# Altium footprint library 3M THD.PcbLib: 163 footprints (part 1 of 14) (continued)
## 3M_2540-6002RB [mm] "40 Contacts - Straight .100\" x .100\" Low Profile Four-Wall Header" (continued)

## 3M_2550-6002RB [mm] "50 Contacts - Straight .100\" x .100\" Low Profile Four-Wall Header"
height 10.03
pads (50):
  round 1.6 hole 1: 1(-30.48,-1.27) 2(-30.48,1.27) 3(-27.94,-1.27) 4(-27.94,1.27) 5(-25.4,-1.27) 6(-25.4,1.27) 7(-22.86,-1.27) 8(-22.86,1.27) 9(-20.32,-1.27) 10(-20.32,1.27) 11(-17.78,-1.27) 12(-17.78,1.27) 13(-15.24,-1.27) 14(-15.24,1.27) 15(-12.7,-1.27) 16(-12.7,1.27) 17(-10.16,-1.27) 18(-10.16,1.27) 19(-7.62,-1.27) 20(-7.62,1.27) 21(-5.08,-1.27) 22(-5.08,1.27) 23(-2.54,-1.27) 24(-2.54,1.27) 25(0,-1.27) 26(0,1.27) 27(2.54,-1.27) 28(2.54,1.27) 29(5.08,-1.27) 30(5.08,1.27) 31(7.62,-1.27) 32(7.62,1.27) 33(10.16,-1.27) 34(10.16,1.27) 35(12.7,-1.27) 36(12.7,1.27) 37(15.24,-1.27) 38(15.24,1.27) 39(17.78,-1.27) 40(17.78,1.27) 41(20.32,-1.27) 42(20.32,1.27) 43(22.86,-1.27) 44(22.86,1.27) 45(25.4,-1.27) 46(25.4,1.27) 47(27.94,-1.27) 48(27.94,1.27) 49(30.48,-1.27) 50(30.48,1.27)
Top Overlay:
  circle w0.3: c-30.48,-4.699 r0.15
  lines w0.2: -34.392,-1.603 -31.979,-1.603 -31.979,1.603 -34.392,1.603 ; -34.392,-1.524 -34.696,-1.524 -34.696,1.524 -34.392,1.524 ; -31.344,-4.064 -30.48,-3.2 -29.616,-4.064 ; -29.528,3.15 -34.392,3.15 -34.392,-3.2 -2.096,-3.2 ; -29.528,4.064 -29.528,2.159 -28.819,2.159 ; -27.711,-3.835 -27.711,-3.2 ; -25.629,-3.835 -25.629,-3.2 ; -25.337,2.518 -25.337,4.064 ; -25.337,3.15 25.337,3.15 ; -2.096,-4.064 -2.096,-2.438 ; 2.095,-4.064 2.095,-2.438 ; 2.095,-3.2 34.392,-3.2 34.392,3.15 31.75,3.15 ; 25.337,2.518 25.337,4.064 ; 28.169,-3.835 28.169,-3.2 ; 28.819,2.159 29.528,2.159 29.528,4.064 ; 30.251,-3.835 30.251,-3.2 ; 34.392,-1.603 31.979,-1.603 31.979,1.603 34.392,1.603 ; 34.392,-1.524 34.696,-1.524 34.696,1.524 34.392,1.524 ; -35.408,-4.064 -35.408,4.064 -34.747,4.064 cw(c-34.29,4.064) -33.833,4.064 -0.457,4.064 cw(c0,4.064) 0.457,4.064 33.833,4.064 cw(c34.29,4.064) 34.747,4.064 35.408,4.064 35.408,-4.064 31.242,-4.064 31.242,-3.835 27.178,-3.835 27.178,-4.064 -24.638,-4.064 -24.638,-3.835 -28.702,-3.835 -28.702,-4.064 -35.408,-4.064
  text "50" at 29.845,2.667 h1.02
Mechanical 14:
  lines w0.1: -34.392,-1.603 -31.979,-1.603 -31.979,1.603 -34.392,1.603 ; -34.392,-1.524 -34.696,-1.524 -34.696,1.524 -34.392,1.524 ; -31.344,-4.064 -30.48,-3.2 -29.616,-4.064 ; -29.528,3.15 -34.392,3.15 -34.392,-3.2 -2.096,-3.2 ; -29.528,4.064 -29.528,2.159 -25.337,2.159 -25.337,4.064 ; -27.711,-3.835 -27.711,-3.2 ; -25.629,-3.835 -25.629,-3.2 ; -25.337,3.15 25.337,3.15 ; -2.096,-4.064 -2.096,-2.159 2.095,-2.159 2.095,-4.064 ; 2.095,-3.2 34.392,-3.2 34.392,3.15 31.75,3.15 ; 25.337,4.064 25.337,2.159 29.528,2.159 29.528,4.064 ; 28.169,-3.835 28.169,-3.2 ; 30.251,-3.835 30.251,-3.2 ; 34.392,-1.603 31.979,-1.603 31.979,1.603 34.392,1.603 ; 34.392,-1.524 34.696,-1.524 34.696,1.524 34.392,1.524 ; -35.408,-4.064 -35.408,4.064 -34.747,4.064 cw(c-34.29,4.064) -33.833,4.064 -0.457,4.064 cw(c0,4.064) 0.457,4.064 33.833,4.064 cw(c34.29,4.064) 34.747,4.064 35.408,4.064 35.408,-4.064 31.242,-4.064 31.242,-3.835 27.178,-3.835 27.178,-4.064 -24.638,-4.064 -24.638,-3.835 -28.702,-3.835 -28.702,-4.064 -35.408,-4.064
  text "50" at 29.845,2.667 h1.02
3D body "3M_2550-6002RB.stp": height 9.65, standoff -2.59, extent -35.408,-4.064 35.408,4.572

## 3M_2560-6002RB [mm] "60 Contacts - Straight .100\" x .100\" Low Profile Four-Wall Header"
height 10.03
pads (60):
  round 1.6 hole 1: 1(-36.83,-1.27) 2(-36.83,1.27) 3(-34.29,-1.27) 4(-34.29,1.27) 5(-31.75,-1.27) 6(-31.75,1.27) 7(-29.21,-1.27) 8(-29.21,1.27) 9(-26.67,-1.27) 10(-26.67,1.27) 11(-24.13,-1.27) 12(-24.13,1.27) 13(-21.59,-1.27) 14(-21.59,1.27) 15(-19.05,-1.27) 16(-19.05,1.27) 17(-16.51,-1.27) 18(-16.51,1.27) 19(-13.97,-1.27) 20(-13.97,1.27) 21(-11.43,-1.27) 22(-11.43,1.27) 23(-8.89,-1.27) 24(-8.89,1.27) 25(-6.35,-1.27) 26(-6.35,1.27) 27(-3.81,-1.27) 28(-3.81,1.27) 29(-1.27,-1.27) 30(-1.27,1.27) 31(1.27,-1.27) 32(1.27,1.27) 33(3.81,-1.27) 34(3.81,1.27) 35(6.35,-1.27) 36(6.35,1.27) 37(8.89,-1.27) 38(8.89,1.27) 39(11.43,-1.27) 40(11.43,1.27) 41(13.97,-1.27) 42(13.97,1.27) 43(16.51,-1.27) 44(16.51,1.27) 45(19.05,-1.27) 46(19.05,1.27) 47(21.59,-1.27) 48(21.59,1.27) 49(24.13,-1.27) 50(24.13,1.27) 51(26.67,-1.27) 52(26.67,1.27) 53(29.21,-1.27) 54(29.21,1.27) 55(31.75,-1.27) 56(31.75,1.27) 57(34.29,-1.27) 58(34.29,1.27) 59(36.83,-1.27) 60(36.83,1.27)
Top Overlay:
  circle w0.3: c-36.83,-4.699 r0.15
  lines w0.2: -40.742,-1.603 -38.329,-1.603 -38.329,1.603 -40.742,1.603 ; -40.742,-1.524 -41.046,-1.524 -41.046,1.524 -40.742,1.524 ; -37.694,-4.064 -36.83,-3.2 -35.966,-4.064 ; -35.878,3.15 -40.742,3.15 -40.742,-3.2 -3.366,-3.2 ; -35.878,4.064 -35.878,2.159 -35.169,2.159 ; -34.061,-3.835 -34.061,-3.2 ; -31.979,-3.835 -31.979,-3.2 ; -31.687,2.518 -31.687,4.064 ; -31.687,3.15 31.687,3.15 ; -3.366,-4.064 -3.366,-2.438 ; 0.826,-4.064 0.826,-2.438 ; 0.826,-3.2 40.742,-3.2 40.742,3.15 38.1,3.15 ; 31.687,2.518 31.687,4.064 ; 34.519,-3.835 34.519,-3.2 ; 35.169,2.159 35.878,2.159 35.878,4.064 ; 36.601,-3.835 36.601,-3.2 ; 40.742,-1.603 38.329,-1.603 38.329,1.603 40.742,1.603 ; 40.742,-1.524 41.046,-1.524 41.046,1.524 40.742,1.524 ; -41.758,-4.064 -41.758,4.064 -41.097,4.064 cw(c-40.64,4.064) -40.183,4.064 -1.727,4.064 cw(c-1.27,4.064) -0.813,4.064 40.183,4.064 cw(c40.64,4.064) 41.097,4.064 41.758,4.064 41.758,-4.064 37.592,-4.064 37.592,-3.835 33.528,-3.835 33.528,-4.064 -30.988,-4.064 -30.988,-3.835 -35.052,-3.835 -35.052,-4.064 -41.758,-4.064
  text "60" at 36.195,2.667 h1.02
Mechanical 14:
  lines w0.1: -40.742,-1.603 -38.329,-1.603 -38.329,1.603 -40.742,1.603 ; -40.742,-1.524 -41.046,-1.524 -41.046,1.524 -40.742,1.524 ; -37.694,-4.064 -36.83,-3.2 -35.966,-4.064 ; -35.878,3.15 -40.742,3.15 -40.742,-3.2 -3.366,-3.2 ; -35.878,4.064 -35.878,2.159 -31.687,2.159 -31.687,4.064 ; -34.061,-3.835 -34.061,-3.2 ; -31.979,-3.835 -31.979,-3.2 ; -31.687,3.15 31.687,3.15 ; -3.366,-4.064 -3.366,-2.159 0.826,-2.159 0.826,-4.064 ; 0.826,-3.2 40.742,-3.2 40.742,3.15 38.1,3.15 ; 31.687,4.064 31.687,2.159 35.878,2.159 35.878,4.064 ; 34.519,-3.835 34.519,-3.2 ; 36.601,-3.835 36.601,-3.2 ; 40.742,-1.603 38.329,-1.603 38.329,1.603 40.742,1.603 ; 40.742,-1.524 41.046,-1.524 41.046,1.524 40.742,1.524 ; -41.758,-4.064 -41.758,4.064 -41.097,4.064 cw(c-40.64,4.064) -40.183,4.064 -1.727,4.064 cw(c-1.27,4.064) -0.813,4.064 40.183,4.064 cw(c40.64,4.064) 41.097,4.064 41.758,4.064 41.758,-4.064 37.592,-4.064 37.592,-3.835 33.528,-3.835 33.528,-4.064 -30.988,-4.064 -30.988,-3.835 -35.052,-3.835 -35.052,-4.064 -41.758,-4.064
  text "60" at 36.195,2.667 h1.02
3D body "3M_2560-6002RB.stp": height 9.65, standoff -2.59, extent -41.758,-4.064 41.758,4.572

## 3M_2564-6002RB [mm] "64 Contacts - Straight .100\" x .100\" Low Profile Four-Wall Header"
height 10.03
pads (64):
  round 1.6 hole 1: 1(-39.37,-1.27) 2(-39.37,1.27) 3(-36.83,-1.27) 4(-36.83,1.27) 5(-34.29,-1.27) 6(-34.29,1.27) 7(-31.75,-1.27) 8(-31.75,1.27) 9(-29.21,-1.27) 10(-29.21,1.27) 11(-26.67,-1.27) 12(-26.67,1.27) 13(-24.13,-1.27) 14(-24.13,1.27) 15(-21.59,-1.27) 16(-21.59,1.27) 17(-19.05,-1.27) 18(-19.05,1.27) 19(-16.51,-1.27) 20(-16.51,1.27) 21(-13.97,-1.27) 22(-13.97,1.27) 23(-11.43,-1.27) 24(-11.43,1.27) 25(-8.89,-1.27) 26(-8.89,1.27) 27(-6.35,-1.27) 28(-6.35,1.27) 29(-3.81,-1.27) 30(-3.81,1.27) 31(-1.27,-1.27) 32(-1.27,1.27) 33(1.27,-1.27) 34(1.27,1.27) 35(3.81,-1.27) 36(3.81,1.27) 37(6.35,-1.27) 38(6.35,1.27) 39(8.89,-1.27) 40(8.89,1.27) 41(11.43,-1.27) 42(11.43,1.27) 43(13.97,-1.27) 44(13.97,1.27) 45(16.51,-1.27) 46(16.51,1.27) 47(19.05,-1.27) 48(19.05,1.27) 49(21.59,-1.27) 50(21.59,1.27) 51(24.13,-1.27) 52(24.13,1.27) 53(26.67,-1.27) 54(26.67,1.27) 55(29.21,-1.27) 56(29.21,1.27) 57(31.75,-1.27) 58(31.75,1.27) 59(34.29,-1.27) 60(34.29,1.27) 61(36.83,-1.27) 62(36.83,1.27) 63(39.37,-1.27) 64(39.37,1.27)
Top Overlay:
  circle w0.3: c-39.37,-4.699 r0.15
  lines w0.2: -43.282,-1.603 -40.869,-1.603 -40.869,1.603 -43.282,1.603 ; -43.282,-1.524 -43.586,-1.524 -43.586,1.524 -43.282,1.524 ; -40.234,-4.064 -39.37,-3.2 -38.506,-4.064 ; -38.418,3.15 -43.282,3.15 -43.282,-3.2 -3.366,-3.2 ; -38.418,4.064 -38.418,2.159 -37.709,2.159 ; -36.601,-3.835 -36.601,-3.2 ; -34.519,-3.835 -34.519,-3.2 ; -34.227,2.518 -34.227,4.064 ; -34.227,3.15 34.227,3.15 ; -3.366,-4.064 -3.366,-2.438 ; 0.826,-4.064 0.826,-2.438 ; 0.826,-3.2 43.282,-3.2 43.282,3.15 40.64,3.15 ; 34.227,2.518 34.227,4.064 ; 37.059,-3.835 37.059,-3.2 ; 37.709,2.159 38.418,2.159 38.418,4.064 ; 39.141,-3.835 39.141,-3.2 ; 43.282,-1.603 40.869,-1.603 40.869,1.603 43.282,1.603 ; 43.282,-1.524 43.586,-1.524 43.586,1.524 43.282,1.524 ; -44.298,-4.064 -37.592,-4.064 -37.592,-3.835 -33.528,-3.835 -33.528,-4.064 36.068,-4.064 36.068,-3.835 40.132,-3.835 40.132,-4.064 44.298,-4.064 44.298,4.064 43.637,4.064 ccw(c43.18,4.064) 42.723,4.064 -0.813,4.064 ccw(c-1.27,4.064) -1.727,4.064 -42.723,4.064 ccw(c-43.18,4.064) -43.637,4.064 -44.298,4.064 -44.298,-4.064
  text "64" at 38.735,2.667 h1.02
Mechanical 14:
  lines w0.1: -43.282,-1.603 -40.869,-1.603 -40.869,1.603 -43.282,1.603 ; -43.282,-1.524 -43.586,-1.524 -43.586,1.524 -43.282,1.524 ; -40.234,-4.064 -39.37,-3.2 -38.506,-4.064 ; -38.418,3.15 -43.282,3.15 -43.282,-3.2 -3.366,-3.2 ; -38.418,4.064 -38.418,2.159 -34.227,2.159 -34.227,4.064 ; -36.601,-3.835 -36.601,-3.2 ; -34.519,-3.835 -34.519,-3.2 ; -34.227,3.15 34.227,3.15 ; -3.366,-4.064 -3.366,-2.159 0.826,-2.159 0.826,-4.064 ; 0.826,-3.2 43.282,-3.2 43.282,3.15 40.64,3.15 ; 34.227,4.064 34.227,2.159 38.418,2.159 38.418,4.064 ; 37.059,-3.835 37.059,-3.2 ; 39.141,-3.835 39.141,-3.2 ; 43.282,-1.603 40.869,-1.603 40.869,1.603 43.282,1.603 ; 43.282,-1.524 43.586,-1.524 43.586,1.524 43.282,1.524 ; -44.298,-4.064 -37.592,-4.064 -37.592,-3.835 -33.528,-3.835 -33.528,-4.064 36.068,-4.064 36.068,-3.835 40.132,-3.835 40.132,-4.064 44.298,-4.064 44.298,4.064 43.637,4.064 ccw(c43.18,4.064) 42.723,4.064 -0.813,4.064 ccw(c-1.27,4.064) -1.727,4.064 -42.723,4.064 ccw(c-43.18,4.064) -43.637,4.064 -44.298,4.064 -44.298,-4.064
  text "64" at 38.735,2.667 h1.02
3D body "3M_2564-6002RB.stp": height 9.65, standoff -2.59, extent -44.298,-4.064 44.298,4.572

## 3M_3372-5202RB [mm] "3M, 3000 Series, 60 Contacts - Pitch 2.54mm - Right Angle Four-Wall Header (Grey) With Short Roll Pin Latch/Ejectors"
height 8.6
pads (62):
  round 1.6 hole 0.9: 1(-36.83,-1.27) 2(-36.83,1.27) 3(-34.29,-1.27) 4(-34.29,1.27) 5(-31.75,-1.27) 6(-31.75,1.27) 7(-29.21,-1.27) 8(-29.21,1.27) 9(-26.67,-1.27) 10(-26.67,1.27) 11(-24.13,-1.27) 12(-24.13,1.27) 13(-21.59,-1.27) 14(-21.59,1.27) 15(-19.05,-1.27) 16(-19.05,1.27) 17(-16.51,-1.27) 18(-16.51,1.27) 19(-13.97,-1.27) 20(-13.97,1.27) 21(-11.43,-1.27) 22(-11.43,1.27) 23(-8.89,-1.27) 24(-8.89,1.27) 25(-6.35,-1.27) 26(-6.35,1.27) 27(-3.81,-1.27) 28(-3.81,1.27) 29(-1.27,-1.27) 30(-1.27,1.27) 31(1.27,-1.27) 32(1.27,1.27) 33(3.81,-1.27) 34(3.81,1.27) 35(6.35,-1.27) 36(6.35,1.27) 37(8.89,-1.27) 38(8.89,1.27) 39(11.43,-1.27) 40(11.43,1.27) 41(13.97,-1.27) 42(13.97,1.27) 43(16.51,-1.27) 44(16.51,1.27) 45(19.05,-1.27) 46(19.05,1.27) 47(21.59,-1.27) 48(21.59,1.27) 49(24.13,-1.27) 50(24.13,1.27) 51(26.67,-1.27) 52(26.67,1.27) 53(29.21,-1.27) 54(29.21,1.27) 55(31.75,-1.27) 56(31.75,1.27) 57(34.29,-1.27) 58(34.29,1.27) 59(36.83,-1.27) 60(36.83,1.27)
  round 4.6 hole 2.8: MTG1(-42.735,0.53) MTG2(42.735,0.53)
Top Overlay:
  circle w0.2: c42.431,6.375 r0.953
  circle w0.2: c-42.405,6.375 r0.953
  circle w0.3: c-36.903,-3.048 r0.15
  lines w0.2: -51.144,9.877 -48.566,14.342 ccw(c-48.654,14.393) -48.603,14.481 -51.518,16.163 -56.623,13.216 ccw(c-56.572,13.128) -56.623,13.04 -49.634,9.005 -47.323,6.25 ; -49.531,12.67 -45.775,10.502 ; -46.279,-2.007 ccw(c-45.771,-2.007) -45.263,-2.007 -44.645,-2.007 -47.739,-2.007 -47.739,5.105 -44.411,14.249 -43.569,14.249 ccw(c-42.405,14.757) -41.135,14.757 -40.293,14.757 -39.851,12.251 ccw(c-38.601,12.471) -38.601,11.201 38.626,11.201 ccw(c38.626,12.471) 39.877,12.251 40.319,14.757 41.161,14.757 ccw(c42.431,14.757) 43.595,14.249 44.437,14.249 47.765,5.105 47.765,-2.007 44.645,-2.007 45.288,-2.007 ccw(c45.796,-2.007) 46.304,-2.007 ; -38.005,11.201 -36.735,9.002 -36.198,9.931 ; -36.506,11.201 -36.506,9.931 -34.588,9.931 -34.588,11.201 ; 0.521,5.105 4.585,5.105 ; 0.521,11.201 0.521,3.581 4.585,3.581 4.585,11.201 ; 0.953,5.105 0.953,11.201 1.588,11.201 1.588,5.105 ; 3.493,5.105 3.493,11.201 4.128,11.201 4.128,5.105 ; 45.801,10.502 49.557,12.67 ; 47.348,6.25 49.66,9.005 56.649,13.04 ccw(c56.598,13.128) 56.649,13.216 51.543,16.163 48.629,14.481 ccw(c48.68,14.393) 48.592,14.342 51.17,9.877
  text "60" at 35.99,2.739 h1.2
  text "1" at -38.862,-1.7 h1.2
Mechanical 8:
  drawing of 252 lines, arcs and shapes, not listed
Mechanical 14:
  circle w0.1: c42.431,6.375 r0.953
  circle w0.1: c-42.405,6.375 r0.953
  circle w0.1: c42.748,0.533 r1.27
  circle w0.1: c-42.723,0.533 r1.27
  lines w0.1: -51.144,9.877 -48.566,14.342 ccw(c-48.654,14.393) -48.603,14.481 -51.518,16.163 -56.623,13.216 ccw(c-56.572,13.128) -56.623,13.04 -49.634,9.005 -47.323,6.25 ; -49.531,12.67 -45.775,10.502 ; -46.279,-2.007 ccw(c-45.771,-2.007) -45.263,-2.007 ; -45.225,-2.007 -45.225,1.978 -42.723,3.422 -40.221,1.978 -40.221,-2.007 ; -38.005,11.201 -36.735,9.002 -36.198,9.931 ; -36.506,11.201 -36.506,9.931 -34.588,9.931 -34.588,11.201 ; -4.305,-2.007 ccw(c-3.797,-2.007) -3.289,-2.007 8.395,-2.007 ccw(c8.903,-2.007) 9.411,-2.007 ; 0.521,5.105 4.585,5.105 ; 0.521,11.201 0.521,3.581 4.585,3.581 4.585,11.201 ; 0.953,5.105 0.953,11.201 1.588,11.201 1.588,5.105 ; 3.493,5.105 3.493,11.201 4.128,11.201 4.128,5.105 ; 40.246,-2.007 40.246,1.978 42.748,3.422 45.25,1.978 45.25,-2.007 ; 45.288,-2.007 ccw(c45.796,-2.007) 46.304,-2.007 ; 45.801,10.502 49.557,12.67 ; 47.348,6.25 49.66,9.005 56.649,13.04 ccw(c56.598,13.128) 56.649,13.216 51.543,16.163 48.629,14.481 ccw(c48.68,14.393) 48.592,14.342 51.17,9.877 ; -47.739,-2.007 47.765,-2.007 47.765,5.105 44.437,14.249 43.595,14.249 cw(c42.431,14.757) 41.161,14.757 40.319,14.757 39.877,12.251 cw(c38.626,12.471) 38.626,11.201 -38.601,11.201 cw(c-38.601,12.471) -39.851,12.251 -40.293,14.757 -41.135,14.757 cw(c-42.405,14.757) -43.569,14.249 -44.411,14.249 -47.739,5.105 -47.739,-2.007
  text "60" at 35.99,2.739 h1.2
  text "1" at -38.862,-1.7 h1.2
3D body "3M_3372-5202RB.stp": height 8.64, standoff -2.84, extent -56.668,-2.514 56.694,16.179

## 3M_3372-5202RB_a [mm] "3M, 3000 Series, 60 Contacts - Pitch 2.54mm - Right Angle Four-Wall Header (Grey) With Short Roll Pin Latch/Ejectors"
height 8.6
pads (62):
  round 1.6 hole 0.9: 1(-36.83,-1.27) 2(-36.83,1.27) 3(-34.29,-1.27) 4(-34.29,1.27) 5(-31.75,-1.27) 6(-31.75,1.27) 7(-29.21,-1.27) 8(-29.21,1.27) 9(-26.67,-1.27) 10(-26.67,1.27) 11(-24.13,-1.27) 12(-24.13,1.27) 13(-21.59,-1.27) 14(-21.59,1.27) 15(-19.05,-1.27) 16(-19.05,1.27) 17(-16.51,-1.27) 18(-16.51,1.27) 19(-13.97,-1.27) 20(-13.97,1.27) 21(-11.43,-1.27) 22(-11.43,1.27) 23(-8.89,-1.27) 24(-8.89,1.27) 25(-6.35,-1.27) 26(-6.35,1.27) 27(-3.81,-1.27) 28(-3.81,1.27) 29(-1.27,-1.27) 30(-1.27,1.27) 31(1.27,-1.27) 32(1.27,1.27) 33(3.81,-1.27) 34(3.81,1.27) 35(6.35,-1.27) 36(6.35,1.27) 37(8.89,-1.27) 38(8.89,1.27) 39(11.43,-1.27) 40(11.43,1.27) 41(13.97,-1.27) 42(13.97,1.27) 43(16.51,-1.27) 44(16.51,1.27) 45(19.05,-1.27) 46(19.05,1.27) 47(21.59,-1.27) 48(21.59,1.27) 49(24.13,-1.27) 50(24.13,1.27) 51(26.67,-1.27) 52(26.67,1.27) 53(29.21,-1.27) 54(29.21,1.27) 55(31.75,-1.27) 56(31.75,1.27) 57(34.29,-1.27) 58(34.29,1.27) 59(36.83,-1.27) 60(36.83,1.27)
  round 4.6 hole 2.8: MTG1(-42.735,0.53) MTG2(42.735,0.53)
Top Overlay:
  circle w0.3: c-36.903,-3.048 r0.15
  circle w0.2: c-42.405,6.375 r0.953
  circle w0.2: c42.431,6.375 r0.953
  lines w0.2: -46.279,-2.007 ccw(c-45.771,-2.007) -45.263,-2.007 -44.645,-2.007 -47.739,-2.007 -47.739,5.105 -44.411,14.249 -43.569,14.249 ccw(c-42.405,14.757) -41.135,14.757 -40.293,14.757 -39.851,12.251 ccw(c-38.601,12.471) -38.601,11.201 38.626,11.201 ccw(c38.626,12.471) 39.877,12.251 40.319,14.757 41.161,14.757 ccw(c42.431,14.757) 43.595,14.249 44.437,14.249 47.765,5.105 47.765,-2.007 44.645,-2.007 45.288,-2.007 ccw(c45.796,-2.007) 46.304,-2.007 ; -38.005,11.201 -36.735,9.002 -36.198,9.931 ; -36.506,11.201 -36.506,9.931 -34.588,9.931 -34.588,11.201 ; -2.019,5.105 2.045,5.105 ; -2.019,11.201 -2.019,3.581 2.045,3.581 2.045,11.201 ; -1.587,5.105 -1.587,11.201 -0.952,11.201 -0.952,5.105 ; 0.953,5.105 0.953,11.201 1.588,11.201 1.588,5.105 ; 40.526,14.757 40.526,20.337 ; 43.752,14.249 43.752,22.024 ccw(c43.65,22.024) 43.599,22.112 38.494,19.164 38.494,15.799 ccw(c38.595,15.799) 38.595,15.697 43.752,15.697 ; -43.726,22.024 cw(c-43.624,22.024) -43.574,22.112 ; -43.726,22.024 cw(c-43.624,22.024) -43.574,22.112 ; -43.726,22.024 -43.726,14.249 -43.726,22.024 ; -43.574,22.112 -38.468,19.164 ; -43.574,22.112 -38.468,19.164 ; -38.57,15.697 ccw(c-38.57,15.799) -38.468,15.799 ; -38.57,15.697 ccw(c-38.57,15.799) -38.468,15.799 ; -38.57,15.697 -43.726,15.697 -38.57,15.697 ; -38.468,15.799 -38.468,19.164 ; -38.468,15.799 -38.468,19.164 ; -40.524,14.757 -40.508,20.341 -40.524,14.757
  text "1" at -38.862,-1.7 h1.2
  text "60" at 35.99,2.739 h1.2
Mechanical 8:
  drawing of 252 lines, arcs and shapes, not listed
Mechanical 14:
  circle w0.1: c-42.723,0.533 r1.27
  circle w0.1: c42.748,0.533 r1.27
  circle w0.1: c-42.405,6.375 r0.953
  circle w0.1: c42.431,6.375 r0.953
  lines w0.1: -46.279,-2.007 ccw(c-45.771,-2.007) -45.263,-2.007 ; -45.225,-2.007 -45.225,1.978 -42.723,3.422 -40.221,1.978 -40.221,-2.007 ; -38.005,11.201 -36.735,9.002 -36.198,9.931 ; -36.506,11.201 -36.506,9.931 -34.588,9.931 -34.588,11.201 ; -4.305,-2.007 ccw(c-3.797,-2.007) -3.289,-2.007 8.395,-2.007 ccw(c8.903,-2.007) 9.411,-2.007 ; -2.019,5.105 2.045,5.105 ; -2.019,11.201 -2.019,3.581 2.045,3.581 2.045,11.201 ; -1.587,5.105 -1.587,11.201 -0.952,11.201 -0.952,5.105 ; 0.953,5.105 0.953,11.201 1.588,11.201 1.588,5.105 ; 40.246,-2.007 40.246,1.978 42.748,3.422 45.25,1.978 45.25,-2.007 ; 40.526,14.757 40.526,20.337 ; 43.752,14.249 43.752,22.024 ccw(c43.65,22.024) 43.599,22.112 38.494,19.164 38.494,15.799 ccw(c38.595,15.799) 38.595,15.697 43.752,15.697 ; 45.288,-2.007 ccw(c45.796,-2.007) 46.304,-2.007 ; -43.726,22.024 cw(c-43.624,22.024) -43.574,22.112 ; -43.726,22.024 cw(c-43.624,22.024) -43.574,22.112 ; -43.726,22.024 -43.726,14.249 -43.726,22.024 ; -43.574,22.112 -38.468,19.164 ; -43.574,22.112 -38.468,19.164 ; -38.57,15.697 ccw(c-38.57,15.799) -38.468,15.799 ; -38.57,15.697 ccw(c-38.57,15.799) -38.468,15.799 ; -38.57,15.697 -43.726,15.697 -38.57,15.697 ; -38.468,15.799 -38.468,19.164 ; -38.468,15.799 -38.468,19.164 ; -47.739,-2.007 -47.739,5.105 -44.411,14.249 -43.569,14.249 ccw(c-42.405,14.757) -41.135,14.757 -40.293,14.757 -39.851,12.251 ccw(c-38.601,12.471) -38.601,11.201 38.626,11.201 ccw(c38.626,12.471) 39.877,12.251 40.319,14.757 41.161,14.757 ccw(c42.431,14.757) 43.595,14.249 44.437,14.249 47.765,5.105 47.765,-2.007 -47.739,-2.007 ; -40.524,14.757 -40.508,20.341 -40.524,14.757
  text "1" at -38.862,-1.7 h1.2
  text "60" at 35.99,2.739 h1.2
3D body "3M_3372-5202RB_a.stp": height 8.64, standoff -2.84, extent -47.752,-2.514 47.752,22.125

## 3M_3372-6202RB [mm] "3M, 3000 Series, 60 Contacts - Pitch 2.54mm - Straight Four-Wall Header (Grey) With Short Roll Pin Latch/Ejectors"
height 24.6
pads (62):
  round 1.6 hole 0.9: 1(-36.83,-1.27) 2(-36.83,1.27) 3(-34.29,-1.27) 4(-34.29,1.27) 5(-31.75,-1.27) 6(-31.75,1.27) 7(-29.21,-1.27) 8(-29.21,1.27) 9(-26.67,-1.27) 10(-26.67,1.27) 11(-24.13,-1.27) 12(-24.13,1.27) 13(-21.59,-1.27) 14(-21.59,1.27) 15(-19.05,-1.27) 16(-19.05,1.27) 17(-16.51,-1.27) 18(-16.51,1.27) 19(-13.97,-1.27) 20(-13.97,1.27) 21(-11.43,-1.27) 22(-11.43,1.27) 23(-8.89,-1.27) 24(-8.89,1.27) 25(-6.35,-1.27) 26(-6.35,1.27) 27(-3.81,-1.27) 28(-3.81,1.27) 29(-1.27,-1.27) 30(-1.27,1.27) 31(1.27,-1.27) 32(1.27,1.27) 33(3.81,-1.27) 34(3.81,1.27) 35(6.35,-1.27) 36(6.35,1.27) 37(8.89,-1.27) 38(8.89,1.27) 39(11.43,-1.27) 40(11.43,1.27) 41(13.97,-1.27) 42(13.97,1.27) 43(16.51,-1.27) 44(16.51,1.27) 45(19.05,-1.27) 46(19.05,1.27) 47(21.59,-1.27) 48(21.59,1.27) 49(24.13,-1.27) 50(24.13,1.27) 51(26.67,-1.27) 52(26.67,1.27) 53(29.21,-1.27) 54(29.21,1.27) 55(31.75,-1.27) 56(31.75,1.27) 57(34.29,-1.27) 58(34.29,1.27) 59(36.83,-1.27) 60(36.83,1.27)
  round 4.6 hole 2.6: MTG1(-45.77,-0.254) MTG2(45.77,-0.254)
Top Overlay:
  lines w0.2: -47.752,-2 -47.752,-4.318 47.752,-4.318 47.752,-2 ; -47.752,1.7 -47.752,4.3 47.752,4.3 47.752,1.7 ; -40.767,-3.175 -40.767,3.175 40.767,3.175 40.767,-3.175 -40.767,-3.175 ; -38.1,-3.175 -35.56,-3.175 -36.83,-4.318 -38.1,-3.175
  text "60" at 38.065,1.727 h1.02
  text "1" at -39.167,-2.921 h1.02
Mechanical 8:
  drawing of 260 lines, arcs and shapes, not listed
Mechanical 14:
  circle w0.1: c45.784,-0.254 r1.27
  circle w0.1: c-45.784,-0.254 r1.27
  lines w0.1: -47.752,-3.175 -44.424,-3.175 ; -46.784,-0.254 -45.784,-0.254 ; -45.784,-1.254 -45.784,-0.254 ; -45.784,0.746 -45.784,-0.254 ; -44.784,-0.254 -45.784,-0.254 ; -44.437,-1.778 -37.479,-1.778 -37.479,1.219 -44.437,1.219 ; -44.424,-4.318 -44.424,-1.727 ; -44.424,1.27 -44.424,4.318 ; -43.582,-4.318 -43.582,-1.727 ; -43.582,1.27 -43.582,4.318 ; -41.149,-4.318 -41.148,-1.727 ; -40.767,-1.727 -40.767,-3.175 ; -40.767,1.27 -40.767,3.175 ; -33.979,-4.318 -33.979,-3.175 ; -32.061,-4.318 -32.061,-3.175 ; -3.302,-4.318 -3.302,-3.175 ; 0.762,-4.318 0.762,-3.175 ; 34.601,-4.318 34.601,-3.175 ; 36.519,-4.318 36.519,-3.175 ; 40.306,-4.318 40.306,-3.175 ; 40.306,3.175 40.306,4.318 ; 40.767,-1.727 40.767,-3.175 ; 40.767,1.27 40.767,3.175 ; 41.148,1.27 41.148,4.318 ; 41.189,-4.318 41.189,-1.727 ; 43.582,-4.318 43.582,-1.727 ; 43.582,1.27 43.582,4.318 ; 44.424,-4.318 44.424,-1.727 37.465,-1.727 37.465,1.27 44.424,1.27 44.424,4.318 ; 44.424,-3.175 47.752,-3.175 ; 44.424,3.175 47.752,3.175 ; 44.784,-0.254 45.784,-0.254 ; 45.784,-1.254 45.784,-0.254 ; 45.784,0.746 45.784,-0.254 ; 46.784,-0.254 45.784,-0.254 ; -47.752,-4.318 47.752,-4.318 ; -47.752,-4.318 -47.752,4.318 ; -47.752,-4.318 -47.752,4.318 ; -47.752,-4.318 -47.752,4.318 ; -47.752,4.318 47.752,4.318 ; -40.767,-3.175 40.767,-3.175 ; -40.767,-3.175 -40.767,3.175 ; -40.767,-3.175 -40.767,3.175 ; -40.767,3.175 40.767,3.175 ; 40.767,-3.175 40.767,3.175 ; 40.767,-3.175 40.767,3.175 ; 47.752,-4.318 47.752,4.318 ; 47.752,-4.318 47.752,4.318 ; -47.752,3.175 -44.424,3.175 -47.752,3.175 ; -47.308,-1.134 -45.784,-2.014 -44.26,-1.134 -44.26,0.626 -45.784,1.506 -47.308,0.626 -47.308,-1.134 ; -41.148,1.27 -41.148,4.318 -41.148,1.27 ; -40.306,-4.318 -40.306,-3.175 -40.306,-4.318 ; -40.306,3.175 -40.306,4.318 -40.306,3.175 ; 44.26,-1.134 45.784,-2.014 47.308,-1.134 47.308,0.626 45.784,1.506 44.26,0.626 44.26,-1.134
  text "60" at 38.065,1.727 h1.02
  text "1" at -39.167,-2.921 h1.02
3D body "3M_3372-6202RB.stp": height 18.69, standoff -2.84, extent -56.681,-4.318 56.681,4.318

## 3M_3372-6202RB_a [mm] "3M, 3000 Series, 60 Contacts - Pitch 2.54mm - Straight Four-Wall Header (Grey) With Short Roll Pin Latch/Ejectors"
height 24.6
pads (62):
  round 1.6 hole 0.9: 1(-36.83,-1.27) 2(-36.83,1.27) 3(-34.29,-1.27) 4(-34.29,1.27) 5(-31.75,-1.27) 6(-31.75,1.27) 7(-29.21,-1.27) 8(-29.21,1.27) 9(-26.67,-1.27) 10(-26.67,1.27) 11(-24.13,-1.27) 12(-24.13,1.27) 13(-21.59,-1.27) 14(-21.59,1.27) 15(-19.05,-1.27) 16(-19.05,1.27) 17(-16.51,-1.27) 18(-16.51,1.27) 19(-13.97,-1.27) 20(-13.97,1.27) 21(-11.43,-1.27) 22(-11.43,1.27) 23(-8.89,-1.27) 24(-8.89,1.27) 25(-6.35,-1.27) 26(-6.35,1.27) 27(-3.81,-1.27) 28(-3.81,1.27) 29(-1.27,-1.27) 30(-1.27,1.27) 31(1.27,-1.27) 32(1.27,1.27) 33(3.81,-1.27) 34(3.81,1.27) 35(6.35,-1.27) 36(6.35,1.27) 37(8.89,-1.27) 38(8.89,1.27) 39(11.43,-1.27) 40(11.43,1.27) 41(13.97,-1.27) 42(13.97,1.27) 43(16.51,-1.27) 44(16.51,1.27) 45(19.05,-1.27) 46(19.05,1.27) 47(21.59,-1.27) 48(21.59,1.27) 49(24.13,-1.27) 50(24.13,1.27) 51(26.67,-1.27) 52(26.67,1.27) 53(29.21,-1.27) 54(29.21,1.27) 55(31.75,-1.27) 56(31.75,1.27) 57(34.29,-1.27) 58(34.29,1.27) 59(36.83,-1.27) 60(36.83,1.27)
  round 4.6 hole 2.6: MTG1(-45.77,-0.254) MTG2(45.77,-0.254)
Top Overlay:
  lines w0.2: -47.752,-2 -47.752,-4.318 47.752,-4.318 47.752,-2 ; -47.752,1.7 -47.752,4.3 47.752,4.3 47.752,1.7 ; -40.767,-3.175 40.767,-3.175 40.767,3.175 -40.767,3.175 -40.767,-3.175 ; -38.1,-3.175 -36.83,-4.318 -35.56,-3.175 -38.1,-3.175
  text "1" at -39.167,-2.921 h1.02
  text "60" at 38.065,1.727 h1.02
Mechanical 8:
  drawing of 260 lines, arcs and shapes, not listed
Mechanical 14:
  circle w0.1: c-45.784,-0.254 r1.27
  circle w0.1: c45.784,-0.254 r1.27
  lines w0.1: -47.752,-3.175 -44.424,-3.175 ; -46.784,-0.254 -45.784,-0.254 ; -45.784,-1.254 -45.784,-0.254 ; -45.784,0.746 -45.784,-0.254 ; -44.784,-0.254 -45.784,-0.254 ; -44.424,-4.318 -44.424,-1.727 ; -44.424,1.27 -44.424,4.318 ; -43.582,-4.318 -43.582,-1.727 ; -43.582,1.27 -43.582,4.318 ; -41.149,-4.318 -41.148,-1.727 ; -40.767,-1.727 -40.767,-3.175 ; -40.767,1.27 -40.767,3.175 ; -33.979,-4.318 -33.979,-3.175 ; -32.061,-4.318 -32.061,-3.175 ; -3.302,-4.318 -3.302,-3.175 ; 0.762,-4.318 0.762,-3.175 ; 34.601,-4.318 34.601,-3.175 ; 36.519,-4.318 36.519,-3.175 ; 40.306,-4.318 40.306,-3.175 ; 40.306,3.175 40.306,4.318 ; 40.767,-1.727 40.767,-3.175 ; 40.767,1.27 40.767,3.175 ; 41.148,1.27 41.148,4.318 ; 41.189,-4.318 41.189,-1.727 ; 43.582,-4.318 43.582,-1.727 ; 43.582,1.27 43.582,4.318 ; 44.424,-4.318 44.424,-1.727 37.465,-1.727 37.465,1.27 44.424,1.27 44.424,4.318 ; 44.424,-3.175 47.752,-3.175 ; 44.424,3.175 47.752,3.175 ; 44.784,-0.254 45.784,-0.254 ; 45.784,-1.254 45.784,-0.254 ; 45.784,0.746 45.784,-0.254 ; 46.784,-0.254 45.784,-0.254 ; -47.752,-4.318 -47.752,4.318 ; -47.752,-4.318 -47.752,4.318 ; -47.752,-4.318 -47.752,4.318 ; -47.752,-4.318 47.752,-4.318 ; -47.752,4.318 47.752,4.318 ; -40.767,-3.175 -40.767,3.175 ; -40.767,-3.175 -40.767,3.175 ; -40.767,-3.175 40.767,-3.175 ; -40.767,3.175 40.767,3.175 ; 40.767,-3.175 40.767,3.175 ; 40.767,-3.175 40.767,3.175 ; 47.752,-4.318 47.752,4.318 ; 47.752,-4.318 47.752,4.318 ; -47.752,3.175 -44.424,3.175 -47.752,3.175 ; -47.308,-1.134 -47.308,0.626 -45.784,1.506 -44.26,0.626 -44.26,-1.134 -45.784,-2.014 -47.308,-1.134 ; -41.148,1.27 -41.148,4.318 -41.148,1.27 ; -40.306,-4.318 -40.306,-3.175 -40.306,-4.318 ; -40.306,3.175 -40.306,4.318 -40.306,3.175 ; 44.26,-1.134 44.26,0.626 45.784,1.506 47.308,0.626 47.308,-1.134 45.784,-2.014 44.26,-1.134
  text "1" at -39.167,-2.921 h1.02
  text "60" at 38.065,1.727 h1.02
3D body "3M_3372-6202RB_a.stp": height 24.64, standoff -2.84, extent -47.752,-4.318 47.752,4.318